# Altium footprint library 2.52-直插元件.PcbLib: 467 footprints (part 12 of 30)
Each footprint in its own frame and in the unit in brackets; x right, y up, seen from the top. Pads: shape width x height; smd on the part's side, far side on the other; paste and mask are expansions set on the pad; w line width, h text height; cw(c..) or ccw(c..) is an arc to the next point about the centre after c.
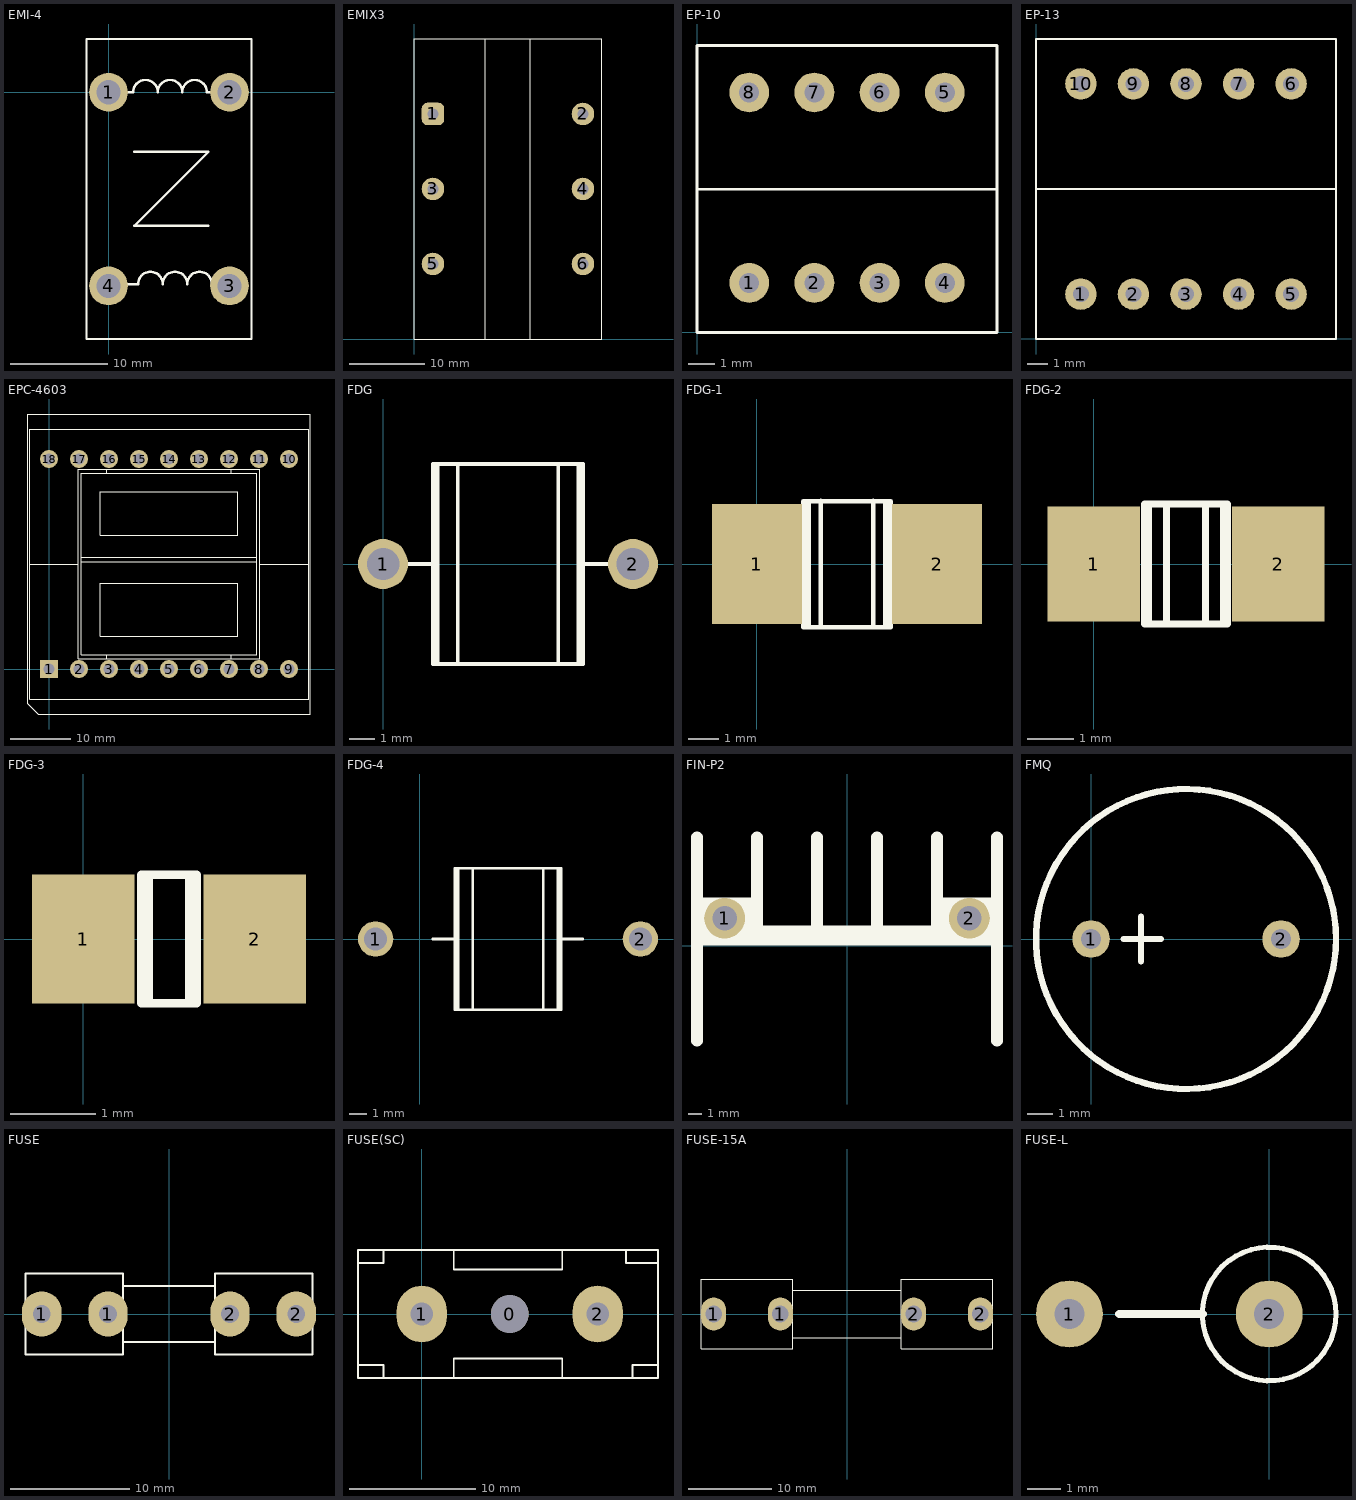
[diagram p11: the footprints below, top view; thin cyan lines are the x and y axes]

## EMI-4 [mm]
pads (4):
  round 4 hole 2.5: 1(0,0) 2(12.5,0) 3(12.5,-20) 4(0,-20)
Top Overlay:
  lines w0.203: -2.261,-25.486 14.757,-25.486 14.757,5.502 -2.261,5.502 -2.261,-25.486
  lines w0.254: 0.208,0 2.548,0 cw(c3.818,0) 5.088,0 cw(c6.358,0) 7.628,0 cw(c8.898,0) 10.168,0 12.5,0 ; 0.716,-19.812 3.056,-19.812 cw(c4.326,-19.812) 5.596,-19.812 cw(c6.866,-19.812) 8.136,-19.812 cw(c9.406,-19.812) 10.676,-19.812 13.008,-19.812 ; 2.68,-6.164 10.3,-6.164 ; 9.284,-6.164 10.3,-6.164 ; 9.792,-6.164 10.3,-6.164 ; 10.3,-13.784 2.68,-13.784 10.3,-6.164
3D body "User Library-indutancia vac.STEP": height 36, standoff -5, extent -3.502,-24.492 15.998,4.508

## EMIX3 [mm]
pads (6):
  rrect50% 3x3 hole 1.5: 1(2.5,30)
  round 3 hole 1.5: 2(22.5,30) 3(2.5,20) 4(22.5,20) 5(2.5,10) 6(22.5,10)
Top Overlay:
  lines w0.15: 9.5,0 9.5,40 ; 15.5,0 15.5,40 ; 0,0 25,0 25,40 0,40 0,0
3D body "DL001.STEP": height 39.29, standoff -4, extent 0,0 25,40

## EP-10 [mil]
pads (8):
  round 60 hole 30: 1(78.74,74.8) 2(177.17,74.8) 3(275.59,74.8) 4(374.02,74.8) 5(374.02,362.2) 6(275.59,362.2) 7(177.17,362.2) 8(78.74,362.2)
Top Overlay:
  lines w3.94: 0,216.14 452.76,216.14 ; 0,0 0,433.07 452.76,433.07 452.76,0 0,0
3D body "ep10.STEP": height 441.63, standoff -160.73, extent 0,0 452.75,433.07

## EP-13 [mil] "淘宝ID:黄晶宝石   店铺网址:https://shop463601444.taobao.com"
pads (10):
  round 60 hole 30: 1(85.43,85.43) 2(185.43,85.43) 3(285.43,85.43) 4(385.43,85.43) 5(485.43,85.43) 6(485.43,485.43) 7(385.43,485.43) 8(285.43,485.43) 9(185.43,485.43) 10(85.43,485.43)
Top Overlay:
  lines w3.94: 0,285.43 570.87,285.43 ; 0,0 0,570.87 570.87,570.87 570.87,0 0,0
3D body "EP13.STEP": height 488.19, standoff -157.48, extent 29.49,29.49 541.38,541.38

## EPC-4603 [mm]
pads (18):
  rect 3x3 hole 1.8: 1(0,0)
  round 3 hole 1.8: 2(5,0) 3(10,0) 4(15,0) 5(20,0) 6(25,0) 7(30,0) 8(35,0) 9(40,0) 10(40,35) 11(35,35) 12(30,35) 13(25,35) 14(20,35) 15(15,35) 16(10,35) 17(5,35) 18(0,35)
Top Overlay:
  lines w0.1: 5.354,17.85 34.649,17.85 ; 5.354,18.65 34.649,18.65 ; 9.6,1.7 9.6,2.346 ; 9.6,32.654 9.6,33.3 ; 30.4,1.7 30.4,2.341 ; 30.4,32.659 30.4,33.3 ; -3.25,17.5 4.9,17.5 ; -3.25,17.5 -3.25,-5 43.25,-5 43.25,17.5 ; -3.25,17.5 -3.25,40 43.25,40 43.25,17.5 ; 4.9,17.5 4.9,1.7 35.1,1.7 35.1,17.5 ; 4.9,17.5 4.9,33.3 35.1,33.3 35.1,17.5 ; 35.1,17.5 43.25,17.5 ; -3.5,-5.819 -1.819,-7.5 43.5,-7.5 43.5,42.5 -3.5,42.5 -3.5,-5.819 ; 5.35,2.35 34.65,2.35 34.65,32.65 5.35,32.65 5.35,2.35 ; 8.5,5.5 31.5,5.5 31.5,14.25 8.5,14.25 8.5,5.5 ; 8.5,22.25 31.5,22.25 31.5,29.5 8.5,29.5 8.5,22.25
3D body "变?": height 29.5, standoff -5, extent -3.5,-7.5 43.5,42.5

## FDG [mm] "淘宝ID:黄晶宝石   店铺网址:https://shop463601444.taobao.com"
pads (2):
  round 2 hole 1.3: 1(0,0) 2(10,0)
Top Overlay:
  lines w0.15: 0.738,-0.004 2,-0.004 ; 2.1,-4 2.1,4 ; 2.187,-3.98 2.187,4 ; 2.994,-3.981 2.994,4 ; 7.006,-3.981 7.006,4 ; 7.813,-3.98 7.813,4 ; 7.9,-4 7.9,4 ; 8,0 9.233,-0.001 ; 2,-4 8,-4 8,4 2,4 2,-4
3D body "flg.STEP": height 10, standoff -2.22, extent -0.96,-4 10.96,4

## FDG-1 [mm]
pads (2):
  rect 3x4 smd: 1(0,0) 2(6,0)
Top Overlay:
  lines w0.15: 1.641,-2.101 1.641,2.099 ; 1.728,-2.101 1.728,2.099 ; 2.123,-2.098 2.123,2.102 ; 3.877,-2.098 3.877,2.102 ; 4.272,-2.101 4.272,2.099 ; 4.359,-2.101 4.359,2.099 ; 1.541,-2.101 1.541,2.099 4.459,2.099 4.459,-2.101 1.541,-2.101
3D body "User Library-ATC-c.step": height 6.39, standoff 0.01, extent 0.08,-2.1 5.92,2.1

## FDG-2 [mm]
pads (2):
  rect 2x2.5 smd: 1(0,0) 2(4,0)
Top Overlay:
  lines w0.15: 1.187,-1.3 1.187,1.3 ; 1.582,-1.3 1.582,1.3 ; 2.418,-1.3 2.418,1.3 ; 2.813,-1.3 2.813,1.3 ; 1.1,-1.3 2.9,-1.3 2.9,1.3 1.1,1.3 1.1,-1.3
3D body "User Library-ATC-b.step": height 2.81, standoff -0.01, extent 0.605,-1.291 3.395,1.309

## FDG-3 [mm]
pads (2):
  rect 1.2x1.5 smd: 1(0,0) 2(2,0)
Top Overlay:
  lines w0.1: 0.762,-0.75 0.762,0.75 ; 1.238,-0.75 1.238,0.75 ; 0.675,-0.75 0.675,0.75 1.325,0.75 1.325,-0.75 0.675,-0.75
3D body "User Library-ATC-a.step": height 1.42, standoff -0.01, extent 0.3,-0.73 1.7,0.73

## FDG-4 [mm]
pads (2):
  round 2 hole 1.3: 1(-2.5,0) 2(12.5,0)
Top Overlay:
  lines w0.15: 0.738,-0.004 2,-0.004 ; 2.1,-4 2.1,4 ; 2.187,-3.98 2.187,4 ; 2.994,-3.981 2.994,4 ; 7.006,-3.981 7.006,4 ; 7.813,-3.98 7.813,4 ; 7.9,-4 7.9,4 ; 8,0 9.233,-0.001 ; 2,-4 2,4 8,4 8,-4 2,-4
3D body "User Library-EC350X.step": height 8, standoff -1.74, extent -3,-4 13,4

## FIN-P2 [mm] "散热片"
height 1.9
pads (2):
  round 3 hole 1.8: 1(-9.017,2.032) 2(9.017,2.032)
Top Overlay:
  rectangle: -11.049,0.889 -6.629,3.556
  rectangle: 6.629,1.27 11.049,3.556
  lines w0.85: -11.049,-7 -11.049,8 ; -6.629,0.762 -6.629,8.001 ; -2.21,0.762 -2.21,8.001 ; 2.21,0.762 2.21,8.001 ; 6.629,0.762 6.629,8.001 ; 11.049,-7 11.049,8
  lines w1.5: -10.668,0.762 10.668,0.762

## FMQ [mm]
pads (2):
  round 1.5 hole 0.8: 1(0,0) 2(7.6,0)
Top Overlay:
  circle w0.254: c3.799,0 r6.001
  lines w0.254: 1.3,0 2.8,0 ; 2,-0.9 2,0.9
3D body "User Library-WST-1203UX.STEP": height 9.65, standoff -4.5, extent -5.727,-6 9.727,6

## FUSE [mm]
pads (4):
  oval 3.3x3.8 hole 1.5: 1(-10.64,0) 1(-5.1,0) 2(5.1,0) 2(10.64,0)
Top Overlay:
  lines w0.15: -3.84,-2.35 3.84,-2.35 ; -3.84,2.35 3.84,2.35 ; -12,-3.38 -3.84,-3.38 -3.84,3.38 -12,3.38 -12,-3.38 ; 3.84,-3.38 12,-3.38 12,3.38 3.84,3.38 3.84,-3.38
3D body "User Library-Full Fuse.STEP": height 2.86, standoff -10.04, extent -10.839,-3.095 10.839,3.095

## FUSE(SC) [mm]
pads (3):
  round 3 hole 3: 0(7,0)
  oval 4x4.5 hole 1.8: 1(0,0) 2(14,0)
Top Overlay:
  lines w0.15: -5.08,-4.064 -3.048,-4.064 -3.048,-5.08 ; -5.08,4.064 -3.048,4.064 -3.048,5.08 ; 2.54,-5.08 2.54,-3.556 11.176,-3.556 11.176,-5.08 ; 2.54,5.08 2.54,3.556 11.176,3.556 11.176,5.08 ; 16.256,5.08 16.256,4.064 18.796,4.064 ; 16.764,-5.08 16.764,-4.064 18.796,-4.064 ; -5.08,-5.08 -5.08,5.08 18.796,5.08 18.796,-5.08 -5.08,-5.08
3D body "User Library-ZHL30.step": height 10.5, standoff -2.87, extent -5.451,-5.604 18.949,3.796

## FUSE-15A [mm] "淘宝ID:黄晶宝石   店铺网址:https://shop463601444.taobao.com"
pads (4):
  oval 3x4 hole 2: 1(-16,0) 1(-8,0) 2(8,0) 2(16,0)
Top Overlay:
  lines w0.15: -6.5,-2.85 6.5,-2.85 ; -6.5,2.85 6.5,2.85 ; -17.5,-4.2 -6.5,-4.2 -6.5,4.2 -17.5,4.2 -17.5,-4.2 ; 6.5,-4.2 6.5,4.2 17.5,4.2 17.5,-4.2 6.5,-4.2
3D body "User Library-Fuse Clip.step": height 10.47, standoff -3.05, extent 7.936,-3.825 16.064,3.825
3D body "User Library-Fuse Clip.step": height 10.47, standoff -3.05, extent -16.064,-3.825 -7.936,3.825
3D body "User Library-slo-blo 8a 250v fuse.STEP": height 9.92, standoff 3.57, extent -14.478,-3.175 14.478,3.175

## FUSE-L [mil]
height 511.81
pads (2):
  round 79 hole 35.43: 1(-236.22,0) 2(0,0)
Top Overlay:
  circle w6: c0,0 r79
  lines w10: -177.17,0 -78.74,0
3D body "保险.STEP": height 545.04, standoff -77.66, extent -249.02,-74.21 77.68,83.27